# Altium footprint library 2.52-直插元件.PcbLib: 467 footprints (part 21 of 30)
Each footprint in its own frame and in the unit in brackets; x right, y up, seen from the top. Pads: shape width x height; smd on the part's side, far side on the other; paste and mask are expansions set on the pad; w line width, h text height; cw(c..) or ccw(c..) is an arc to the next point about the centre after c.
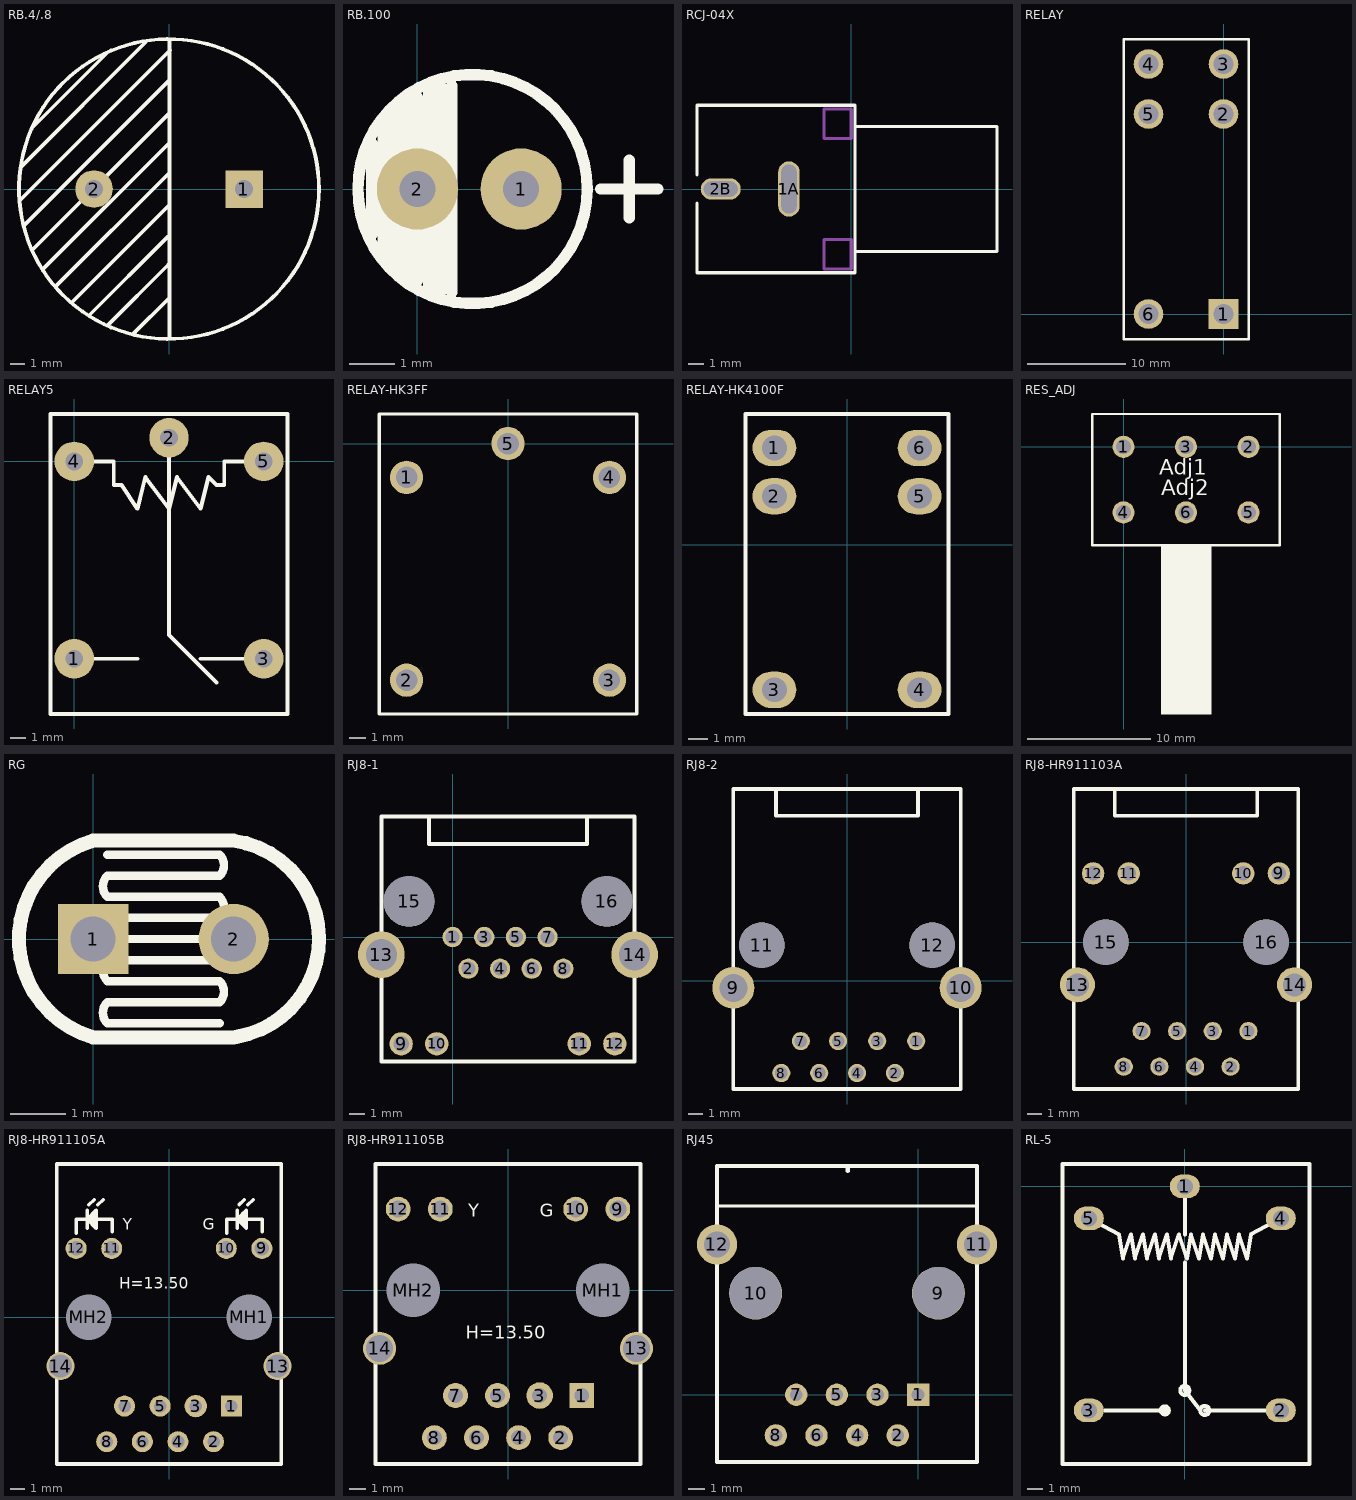
[diagram p20: the footprints below, top view; thin cyan lines are the x and y axes]

## RB.4/.8 [mm]
pads (2):
  rect 2.54x2.54 hole 1.2: 1(5.08,0)
  round 2.54 hole 1.2: 2(-5.08,0)
Top Overlay:
  circle w0.254: c0,0 r10.16
  lines w0.254: -10.033,1.499 -1.575,9.957 ; -10.008,-0.686 0.076,9.398 ; -9.83,-2.464 0.025,7.391 ; -9.322,-4.064 -9.195,-4.064 0.025,5.156 ; -9.195,4.216 -4.115,9.296 ; -8.56,-5.461 0,3.099 0.025,3.099 ; -7.645,-6.579 0,1.067 0.025,1.067 ; -6.579,-7.671 0.025,-1.067 0.025,-0.66 ; -5.436,-8.585 -0.102,-3.251 0.025,-3.251 ; -4.166,-9.246 -0.051,-5.131 -0.051,-5.105 ; -2.438,-9.83 0.025,-7.366 0.025,-7.315 ; 0.025,-10.135 0.025,10.109 0.025,9.601

## RB.100 [mm]
pads (2):
  round 1.8 hole 0.8: 1(2.3,0) 2(0,0)
Top Overlay:
  circle w0.254: c1.224,0 r2.54
  lines w0.254: -1.016,-1.016 -1.016,1.016 ; -0.762,-1.524 -0.762,1.524 ; -0.508,-1.778 -0.508,1.778 ; -0.254,-2.032 -0.254,2.032 ; 0,-2.032 0,2.032 ; 0.254,-2.286 0.254,2.286 ; 0.508,-2.286 0.508,2.286 ; 0.762,-2.286 0.762,2.286 ; 4.064,0 5.334,0 ; 4.699,-0.635 4.699,0.635

## RCJ-04X [mm] "Two Conductor Jack (RCA)"
height 13
pads (2):
  oval 1.4x3.6 hole 1 slot 3.2 at 90 deg: 1A(-4.064,0)
  oval 2.6x1.4 hole 1 slot 2.2 at 0 deg: 2B(-8.509,0)
Top Overlay:
  lines w0.2: -10.057,-0.92 -10.057,-5.461 0.254,-5.461 0.254,5.461 -10.057,5.461 -10.057,0.92 ; 0.254,-4.065 9.5,-4.065 9.5,4.065 0.254,4.065
Mechanical 1:
  lines w0.2: -1.778,-5.207 0,-5.207 0,-3.302 -1.778,-3.302 -1.778,-5.207 ; -1.778,3.302 -1.778,5.207 0,5.207 0,3.302 -1.778,3.302

## RELAY [mm]
pads (6):
  rect 3x3 hole 2: 1(0,0)
  round 3 hole 2: 2(0,20.32) 3(0,25.4) 4(-7.62,25.4) 5(-7.62,20.32) 6(-7.62,0)
Top Overlay:
  lines w0.254: -10.16,-2.54 -10.16,27.94 2.54,27.94 2.54,-2.54 -10.16,-2.54

## RELAY5 [mil]
pads (5):
  round 100 hole 45: 1(0,-500) 2(240,60) 3(480,-500) 4(0,0) 5(480,0)
Top Overlay:
  lines w10: 0,-500 160,-500 ; 0,0 100,0 100,-60 120,-60 160,-120 180,-40 240,-120 260,-40 320,-120 340,-40 360,-60 380,-60 380,0 480,0 ; 240,60 240,-440 360,-560 ; 320,-500 480,-500 ; -60,-640 -60,0 -60,120 540,120 540,-640 -60,-640

## RELAY-HK3FF [mm] "继电器"
height 11.8
pads (5):
  round 2 hole 1.3: 1(-6.096,-2.032) 2(-6.096,-14.224) 3(6.096,-14.224) 4(6.096,-2.032) 5(0,0)
Top Overlay:
  lines w0.2: -7.747,-16.256 7.747,-16.256 7.747,1.778 -7.747,1.778 -7.747,-16.256
3D body: height 12, standoff 0, extent -7.747,-16.256 7.747,1.778

## RELAY-HK4100F [mm] "继电器"
height 11.8
pads (6):
  oval 2.3x1.9 hole 1.3: 1(-3.81,5.08) 2(-3.81,2.54) 3(-3.81,-7.62) 4(3.81,-7.62) 5(3.81,2.54) 6(3.81,5.08)
Top Overlay:
  lines w0.2: -5.334,-8.89 -5.334,6.858 5.334,6.858 5.334,-8.89 -5.334,-8.89
3D body: height 12, standoff 0, extent -5.334,-8.89 5.334,6.858

## RES_ADJ [mm] "Double Adjust Resistor"
height 25
pads (6):
  round 1.8 hole 1.2: 1(0,0) 2(10.16,0) 3(5.08,0) 4(0,-5.334) 5(10.16,-5.334) 6(5.08,-5.334)
Top Overlay:
  region: 3.048,-8.001 7.112,-8.001 7.112,-21.717 3.048,-21.717
  lines w0.2: -2.54,-8.001 12.7,-8.001 12.7,2.667 -2.54,2.667 -2.54,-8.001
  text "Adj1" at 2.921,-2.286 h1.27
  text "Adj2" at 3.048,-3.937 h1.27

## RG [mil]
pads (2):
  rect 50x50 hole 32: 1(0,0)
  round 50 hole 32: 2(100,0)
Top Overlay:
  lines w6: 10,60 90,60 cw(c82.5,52.5) 90,45 10,45 ccw(c17.5,37.5) 10,30 90,30 cw(c82.5,22.5) 90,15 10,15 ccw(c17.5,7.5) 10,0 90,0 cw(c82.5,-7.5) 90,-15 10,-15 ccw(c17.5,-22.5) 10,-30 90,-30 cw(c82.5,-37.5) 90,-45 10,-45 ccw(c17.5,-52.5) 10,-60 90,-60
  lines w10: 100,-70 0,-70 cw(c20,0) 0,70 100,70 cw(c90,0) 101.62,-69.75

## RJ8-1 [mm] "网络"
pads (16):
  round 1.3 hole 0.9: 1(0,0) 2(1.016,-2.032) 3(2.032,0) 4(3.048,-2.032) 5(4.064,0) 6(5.08,-2.032) 7(6.096,0) 8(7.112,-2.032)
  round 1.5 hole 1: 9(-3.302,-6.858) 10(-1.016,-6.858) 11(8.128,-6.858)
  round 1.5 hole 0.9: 12(10.414,-6.858)
  round 3 hole 2: 13(-4.572,-1.143) 14(11.684,-1.143)
  round 3.251 hole 3.251: 15(-2.794,2.286) 16(9.906,2.286)
Top Overlay:
  lines w0.254: -1.524,7.747 -1.524,5.969 8.636,5.969 8.636,7.747 ; -4.572,-8.001 11.684,-8.001 11.684,-1.143 11.684,7.747 -4.572,7.747 -4.572,-1.143 -4.572,-8.001

## RJ8-2 [mm] "网络"
height 10
pads (12):
  round 1.3 hole 0.9: 1(4.953,-4.318) 2(3.429,-6.604) 3(2.159,-4.318) 4(0.72,-6.604) 5(-0.635,-4.318) 6(-1.99,-6.604) 7(-3.302,-4.318) 8(-4.699,-6.604)
  round 3 hole 2: 9(-8.128,-0.508) 10(8.128,-0.508)
  round 3.251 hole 3.251: 11(-6.096,2.54) 12(6.096,2.54)
Top Overlay:
  lines w0.254: -5.08,13.589 -5.08,11.811 5.08,11.811 5.08,13.589 ; -8.128,-7.747 8.128,-7.747 8.128,-0.889 8.128,13.716 -8.128,13.716 -8.128,-0.889 -8.128,-7.747

## RJ8-HR911103A [mm] "网络"
height 10
pads (16):
  round 1.3 hole 0.9: 1(4.45,-6.35) 2(3.18,-8.89) 3(1.91,-6.35) 4(0.64,-8.89) 5(-0.63,-6.35) 6(-1.9,-8.89) 7(-3.17,-6.35) 8(-4.44,-8.89)
  round 1.6 hole 1.02: 9(6.625,4.9) 10(4.085,4.9) 11(-4.085,4.9) 12(-6.625,4.9)
  round 2.5 hole 1.63: 13(-7.745,-3.05) 14(7.745,-3.05)
  round 3.251 hole 3.251: 15(-5.715,0) 16(5.715,0)
Top Overlay:
  lines w0.254: -5.08,10.795 -5.08,9.017 5.08,9.017 5.08,10.795 ; -8,-10.48 -8,10.92 8,10.92 8,-10.48 -8,-10.48

## RJ8-HR911105A [mm]
height 14.8
pads (16):
  rect 1.5x1.5 hole 0.9: 1(4.45,-6.35)
  round 1.5 hole 0.9: 2(3.18,-8.89) 4(0.64,-8.89) 5(-0.63,-6.35) 6(-1.9,-8.89) 7(-3.17,-6.35) 8(-4.44,-8.89)
  round 1.6 hole 0.9: 3(1.91,-6.35)
  round 1.5 hole 1.02: 9(6.625,4.9) 10(4.085,4.9) 11(-4.085,4.9) 12(-6.625,4.9)
  round 2 hole 1.63: 13(7.745,-3.5) 14(-7.745,-3.5)
  round 2.95 hole 3.25 unplated: MH1(5.715,0) MH2(-5.715,0)
Top Overlay:
  lines w0.25: -6.604,5.969 -6.604,6.985 -4.064,6.985 -4.064,6.096 ; -5.842,6.35 -5.842,7.62 ; -5.715,8.001 -5.334,8.382 ; -5.434,6.592 -5.434,7.393 ; -5.08,8.001 -4.699,8.382 ; 4.106,5.969 4.106,6.985 6.646,6.985 6.646,6.096 ; 4.868,6.35 4.868,7.62 ; 4.995,8.001 5.376,8.382 ; 5.276,6.592 5.276,7.393 ; 5.63,8.001 6.011,8.382 ; -8,-10.48 8,-10.48 8,10.92 -8,10.92 -8,-10.48 ; -5.842,6.985 -5.207,6.35 -5.207,7.62 -5.842,6.985 ; 4.868,6.985 5.503,6.35 5.503,7.62 4.868,6.985
  text "H=13.50" at -3.556,2.032 h0.8
  text "Y" at -3.302,6.223 h0.8
  text "G" at 2.413,6.223 h0.8

## RJ8-HR911105B [mm]
height 14.8
pads (16):
  rect 1.5x1.5 hole 0.9: 1(4.45,-6.35)
  round 1.5 hole 0.9: 2(3.18,-8.89) 4(0.64,-8.89) 5(-0.63,-6.35) 6(-1.9,-8.89) 7(-3.17,-6.35) 8(-4.44,-8.89)
  round 1.6 hole 0.9: 3(1.91,-6.35)
  round 1.5 hole 1.02: 9(6.625,4.9) 10(4.085,4.9) 11(-4.085,4.9) 12(-6.625,4.9)
  round 2 hole 1.63: 13(7.745,-3.5) 14(-7.745,-3.5)
  round 2.95 hole 3.25 unplated: MH1(5.715,0) MH2(-5.715,0)
Top Overlay:
  lines w0.25: -8,-10.48 -8,7.62 8,7.62 8,-10.48 -8,-10.48
  text "G" at 1.905,4.445 h0.8
  text "Y" at -2.413,4.445 h0.8
  text "H=13.50" at -2.54,-2.921 h0.8

## RJ45 [mil] "封装库来自淘宝卖家 ID：黄晶宝石"
pads (12):
  rect 55x55 hole 31.5: 1(0,0)
  round 55 hole 31.5: 2(-50,-100) 3(-100,0) 4(-150,-100) 5(-200,0) 6(-250,-100) 7(-300,0) 8(-350,-100)
  round 130 hole 127.95 unplated: 9(50,250) 10(-400,250)
  round 98.42 hole 62.99: 11(145,370) 12(-495,370)
Top Overlay:
  lines w8: -488.19,464.57 141.73,464.57
  lines w10: -495,-165.35 144.65,-165.35 145,-165 145,370 145,562.99 -495,562.99 -495,370 -495,-165 ; -173.23,551.18 -173.23,559.06
3D body "Mod-Jack-K122449007-Stig-W.STEP": height 127.85, standoff -555.12, extent -490,-172.17 139.92,556.17

## RL-5 [mil]
pads (5):
  oval 75x59.06 hole 40: 1(0,0) 2(240,-560) 3(-240,-560) 4(240,-80) 5(-240,-80)
Top Overlay:
  circle w10: c0,-510 r11.18
  circle w10: c-50,-560 r10
  circle w10: c50,-560 r11.18
  lines w10: -240,-80 -165,-120 -155,-180 -135,-120 -125,-180 -105,-120 -95,-180 -75,-120 -65,-180 -45,-120 -35,-180 -15,-120 5,-180 15,-120 35,-180 45,-120 65,-180 75,-120 95,-180 105,-120 125,-180 135,-120 155,-180 165,-120 240,-80 ; -200,-560 -50,-560 ; 0,-190 0,-510 38.82,-560 ; 0,-120 0,-110 0,0 ; 50,-560 195,-560 205,-560 ; -306,-694 -306,56 312,56 312,-694 -306,-694
3D body "User Library-10A12V.STEP": height 629.92, standoff -78.74, extent -301.12,-692 309.12,56.03